# Altium footprint library CPU_STM.PcbLib: 216 footprints (part 12 of 15)
Each footprint in its own frame and in the unit in brackets; x right, y up, seen from the top. Pads: shape width x height; smd on the part's side, far side on the other; paste and mask are expansions set on the pad; w line width, h text height; cw(c..) or ccw(c..) is an arc to the next point about the centre after c.
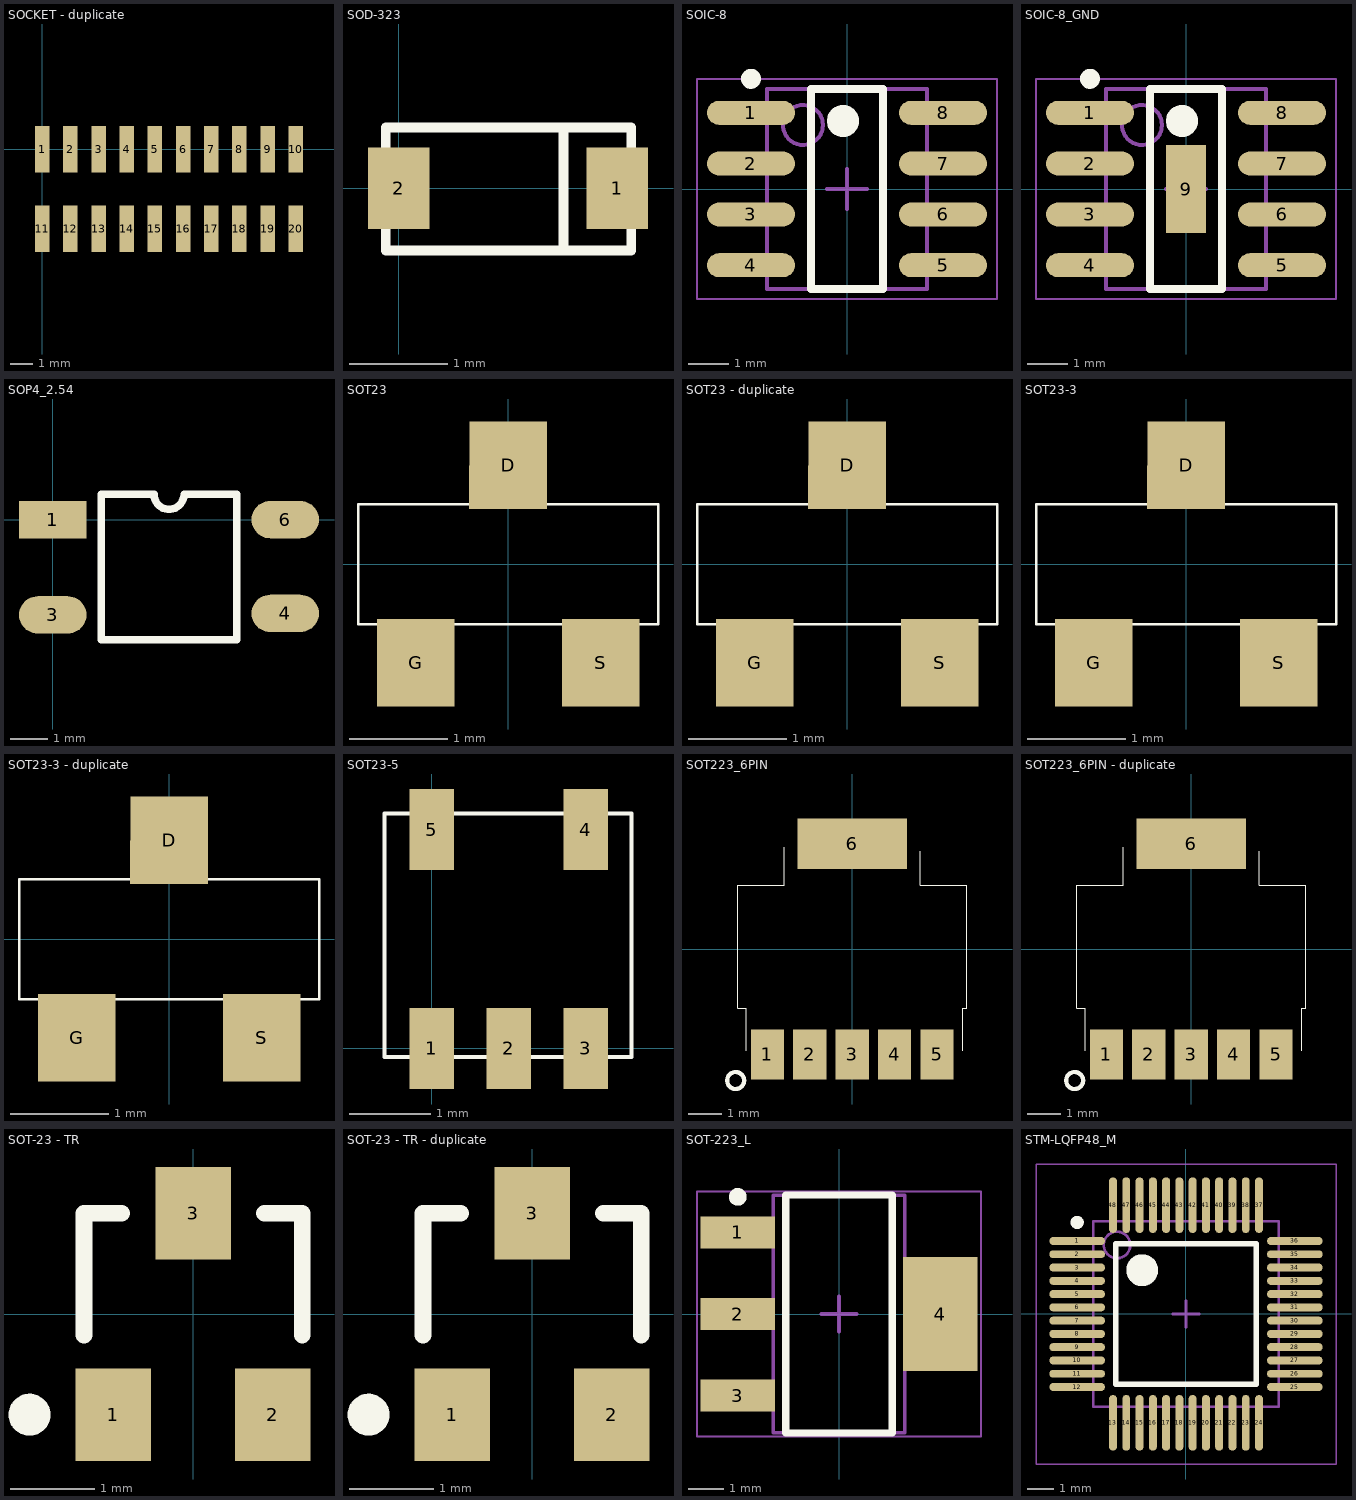
[diagram p11: the footprints below, top view; thin cyan lines are the x and y axes]

## SOCKET - duplicate [mm]
pads (20):
  rect 0.65x2.1 smd: 1(0,0) 2(1.27,0) 3(2.54,0) 4(3.81,0) 5(5.08,0) 6(6.35,0) 7(7.62,0) 8(8.89,0) 9(10.16,0) 10(11.43,0) 11(0,-3.6) 12(1.27,-3.6) 13(2.54,-3.6) 14(3.81,-3.6) 15(5.08,-3.6) 16(6.35,-3.6) 17(7.62,-3.6) 18(8.89,-3.6) 19(10.16,-3.6) 20(11.43,-3.6)

## SOD-323 [mm]
pads (2):
  rect 0.63x0.83 smd: 1(2.225,0) 2(0,0)
Top Overlay:
  lines w0.1: 1.676,-0.635 1.676,0.615 ; -0.132,-0.635 -0.132,0.615 2.368,0.615 2.368,-0.635 -0.132,-0.635
3D body "User Library-SOD323.step": height 0.9, standoff -0.09, extent -0.132,-0.64 2.368,0.61

## SOIC-8 [mm]
pads (8):
  oval 2.2x0.6 smd: 1(-2.4,1.905) 2(-2.4,0.635) 3(-2.4,-0.635) 4(-2.4,-1.905) 5(2.4,-1.905) 6(2.4,-0.635) 7(2.4,0.635) 8(2.4,1.905)
Top Overlay:
  circle w0.25: c-2.4,2.755 r0.125
  circle w0.4: c-0.1,1.7 r0.2
  lines w0.2: -0.9,-2.5 -0.9,2.5 0.9,2.5 0.9,-2.5 -0.9,-2.5
Mechanical 13:
  circle w0.1: c-1.1,1.6 r0.5
  lines w0.1: -2,-2.5 -2,2.5 2,2.5 2,-2.5 -2,-2.5
Mechanical 15:
  lines w0.05: -3.75,-2.75 -3.75,2.75 3.75,2.75 3.75,-2.75 -3.75,-2.75
  lines w0.1: -0.5,0 0.5,0 ; 0,-0.5 0,0.5
3D body "SOIC-8-1.step": height 1.75, standoff 0, extent -3,-2.45 3,2.45

## SOIC-8_GND [mm]
pads (9):
  oval 2.2x0.6 smd: 1(-2.4,1.905) 2(-2.4,0.635) 3(-2.4,-0.635) 4(-2.4,-1.905) 5(2.4,-1.905) 6(2.4,-0.635) 7(2.4,0.635) 8(2.4,1.905)
  rect 1x2.2 smd: 9(0,0)
Top Overlay:
  circle w0.25: c-2.4,2.755 r0.125
  circle w0.4: c-0.1,1.7 r0.2
  lines w0.2: -0.9,-2.5 -0.9,2.5 0.9,2.5 0.9,-2.5 -0.9,-2.5
Mechanical 13:
  circle w0.1: c-1.1,1.6 r0.5
  lines w0.1: -2,-2.5 -2,2.5 2,2.5 2,-2.5 -2,-2.5
Mechanical 15:
  lines w0.05: -3.75,-2.75 -3.75,2.75 3.75,2.75 3.75,-2.75 -3.75,-2.75
  lines w0.1: -0.5,0 0.5,0 ; 0,-0.5 0,0.5
3D body "SOIC-8-1.step": height 1.75, standoff 0, extent -3,-2.45 3,2.45

## SOP4_2.54 [mm]
height 7.2
pads (4):
  rect 1.8x1 smd: 1(0,0)
  oval 1.8x1 smd: 3(0,-2.54) 4(6.2,-2.5) 6(6.2,0)
Top Overlay:
  lines w0.2: 1.3,-3.2 4.9,-3.2 4.9,0.675 3.5,0.675 cw(c3.1,0.675) 2.7,0.675 1.3,0.675 1.3,-3.2

## SOT23 [mil] "SOT23-3"
pads (3):
  rect 31x35 smd: D(0,39.5) G(-37,-39.5) S(37,-39.5)
Top Overlay:
  lines w1: -60,-24 60,-24 60,24 -60,24 -60,-24

## SOT23 - duplicate [mil] "SOT23-3"
pads (3):
  rect 31x35 smd: D(0,39.5) G(-37,-39.5) S(37,-39.5)
Top Overlay:
  lines w1: -60,-24 60,-24 60,24 -60,24 -60,-24

## SOT23-3 [mil] "SOT23-3"
pads (3):
  rect 31x35 smd: D(0,39.5) G(-37,-39.5) S(37,-39.5)
Top Overlay:
  lines w1: -60,-24 -60,24 60,24 60,-24 -60,-24

## SOT23-3 - duplicate [mil] "SOT23-3"
pads (3):
  rect 31x35 smd: D(0,39.5) G(-37,-39.5) S(37,-39.5)
Top Overlay:
  lines w1: -60,-24 -60,24 60,24 60,-24 -60,-24

## SOT23-5 [mm] "R-PDSO-N5"
pads (5):
  rect 0.55x1 smd mask+0.05: 1(0,0) 2(0.95,0) 3(1.9,0) 4(1.9,2.7) 5(0,2.7)
Top Overlay:
  lines w0.05: -0.585,-0.103 2.465,-0.103 2.465,2.897 -0.585,2.897 -0.585,-0.103
3D body "User Library-R-PDSO-G5.step": height 1.3, standoff -0.15, extent -0.585,-0.103 2.465,2.897

## SOT223_6PIN [mil] "SOT223_6PIN"
pads (6):
  rect 39x59 smd: 1(-100,-124) 2(-50,-124) 3(0,-124) 4(50,-124) 5(100,-124)
  rect 129x59 smd: 6(0,124)
Top Overlay:
  circle w5: c-137.28,-154.83 r10
  lines w1: -125,-120 -125,-70 -135,-70 -135,75 -80,75 -80,120 ; 80,115 80,75 135,75 135,-70 130,-70 130,-120

## SOT223_6PIN - duplicate [mil] "SOT223_6PIN"
pads (6):
  rect 39x59 smd: 1(-100,-124) 2(-50,-124) 3(0,-124) 4(50,-124) 5(100,-124)
  rect 129x59 smd: 6(0,124)
Top Overlay:
  circle w5: c-137.28,-154.83 r10
  lines w1: -125,-120 -125,-70 -135,-70 -135,75 -80,75 -80,120 ; 80,115 80,75 135,75 135,-70 130,-70 130,-120

## SOT-23 - TR [mm] "SOT-23; 3 Leads; Body 3.0 x 2.6 mm, inc. leads (LxW max)"
height 1.12
pads (3):
  rect 0.9x1.1 smd: 1(-0.95,-1.2) 2(0.95,-1.2) 3(0,1.2)
Top Overlay:
  circle w0.25: c-1.95,-1.2 r0.125
  lines w0.2: -1.3,-0.25 -1.3,1.2 -0.85,1.2 ; 0.85,1.2 1.3,1.2 1.3,-0.25

## SOT-23 - TR - duplicate [mm] "SOT-23; 3 Leads; Body 3.0 x 2.6 mm, inc. leads (LxW max)"
height 1.12
pads (3):
  rect 0.9x1.1 smd: 1(-0.95,-1.2) 2(0.95,-1.2) 3(0,1.2)
Top Overlay:
  circle w0.25: c-1.95,-1.2 r0.125
  lines w0.2: -1.3,-0.25 -1.3,1.2 -0.85,1.2 ; 0.85,1.2 1.3,1.2 1.3,-0.25

## SOT-223_L [mm]
pads (4):
  rect 2.1x0.9 smd: 1(-2.85,2.3) 2(-2.85,0) 3(-2.85,-2.3)
  rect 2.1x3.2 smd: 4(2.85,0)
Top Overlay:
  circle w0.25: c-2.85,3.3 r0.125
  lines w0.2: -1.5,-3.35 -1.5,3.35 1.5,3.35 1.5,-3.35 -1.5,-3.35
Mechanical 13:
  lines w0.1: -1.85,-3.35 -1.85,3.35 1.85,3.35 1.85,-3.35 -1.85,-3.35
Mechanical 15:
  lines w0.05: -4,-3.45 -4,3.45 4,3.45 4,-3.45 -4,-3.45
  lines w0.1: -0.5,0 0.5,0 ; 0,-0.5 0,0.5
3D body "SOT-223.step": height 1.9, standoff 0.22, extent -3.58,-3.25 3.38,3.25

## STM-LQFP48_M [mm] "QFP, 48-Leads, Body 7x7mm, Pitch 0.5mm, IPC Low Density"
height 1.6
pads (48):
  oval 2.1x0.3 smd mask+0.1: 1(-4.1,2.75) 2(-4.1,2.25) 3(-4.1,1.75) 4(-4.1,1.25) 5(-4.1,0.75) 6(-4.1,0.25) 7(-4.1,-0.25) 8(-4.1,-0.75) 9(-4.1,-1.25) 10(-4.1,-1.75) 11(-4.1,-2.25) 12(-4.1,-2.75) 25(4.1,-2.75) 26(4.1,-2.25) 27(4.1,-1.75) 28(4.1,-1.25) 29(4.1,-0.75) 30(4.1,-0.25) 31(4.1,0.25) 32(4.1,0.75) 33(4.1,1.25) 34(4.1,1.75) 35(4.1,2.25) 36(4.1,2.75)
  oval 0.3x2.1 smd mask+0.1: 13(-2.75,-4.1) 14(-2.25,-4.1) 15(-1.75,-4.1) 16(-1.25,-4.1) 17(-0.75,-4.1) 18(-0.25,-4.1) 19(0.25,-4.1) 20(0.75,-4.1) 21(1.25,-4.1) 22(1.75,-4.1) 23(2.25,-4.1) 24(2.75,-4.1) 37(2.75,4.1) 38(2.25,4.1) 39(1.75,4.1) 40(1.25,4.1) 41(0.75,4.1) 42(0.25,4.1) 43(-0.25,4.1) 44(-0.75,4.1) 45(-1.25,4.1) 46(-1.75,4.1) 47(-2.25,4.1) 48(-2.75,4.1)
Top Overlay:
  circle w0.25: c-4.1,3.45 r0.125
  circle w0.6: c-1.65,1.65 r0.3
  lines w0.2: -2.65,-2.65 -2.65,2.65 2.65,2.65 2.65,-2.65 -2.65,-2.65
Mechanical 13:
  circle w0.1: c-2.6,2.6 r0.5
  lines w0.1: -3.5,-3.5 -3.5,3.5 3.5,3.5 3.5,-3.5 -3.5,-3.5
Mechanical 15:
  lines w0.05: -5.65,-5.65 -5.65,5.65 5.65,5.65 5.65,-5.65 -5.65,-5.65
  lines w0.1: -0.5,0 0.5,0 ; 0,-0.5 0,0.5
3D body "LQFP48-7x7-0_50.step": height 1.5, standoff 0.05, extent -4.5,-4.5 4.5,4.5